# Altium footprint library PCB Library.PcbLib: 19 footprints (part 1 of 2)
Each footprint in its own frame and in the unit in brackets; x right, y up, seen from the top. Pads: shape width x height; smd on the part's side, far side on the other; paste and mask are expansions set on the pad; w line width, h text height; cw(c..) or ccw(c..) is an arc to the next point about the centre after c.
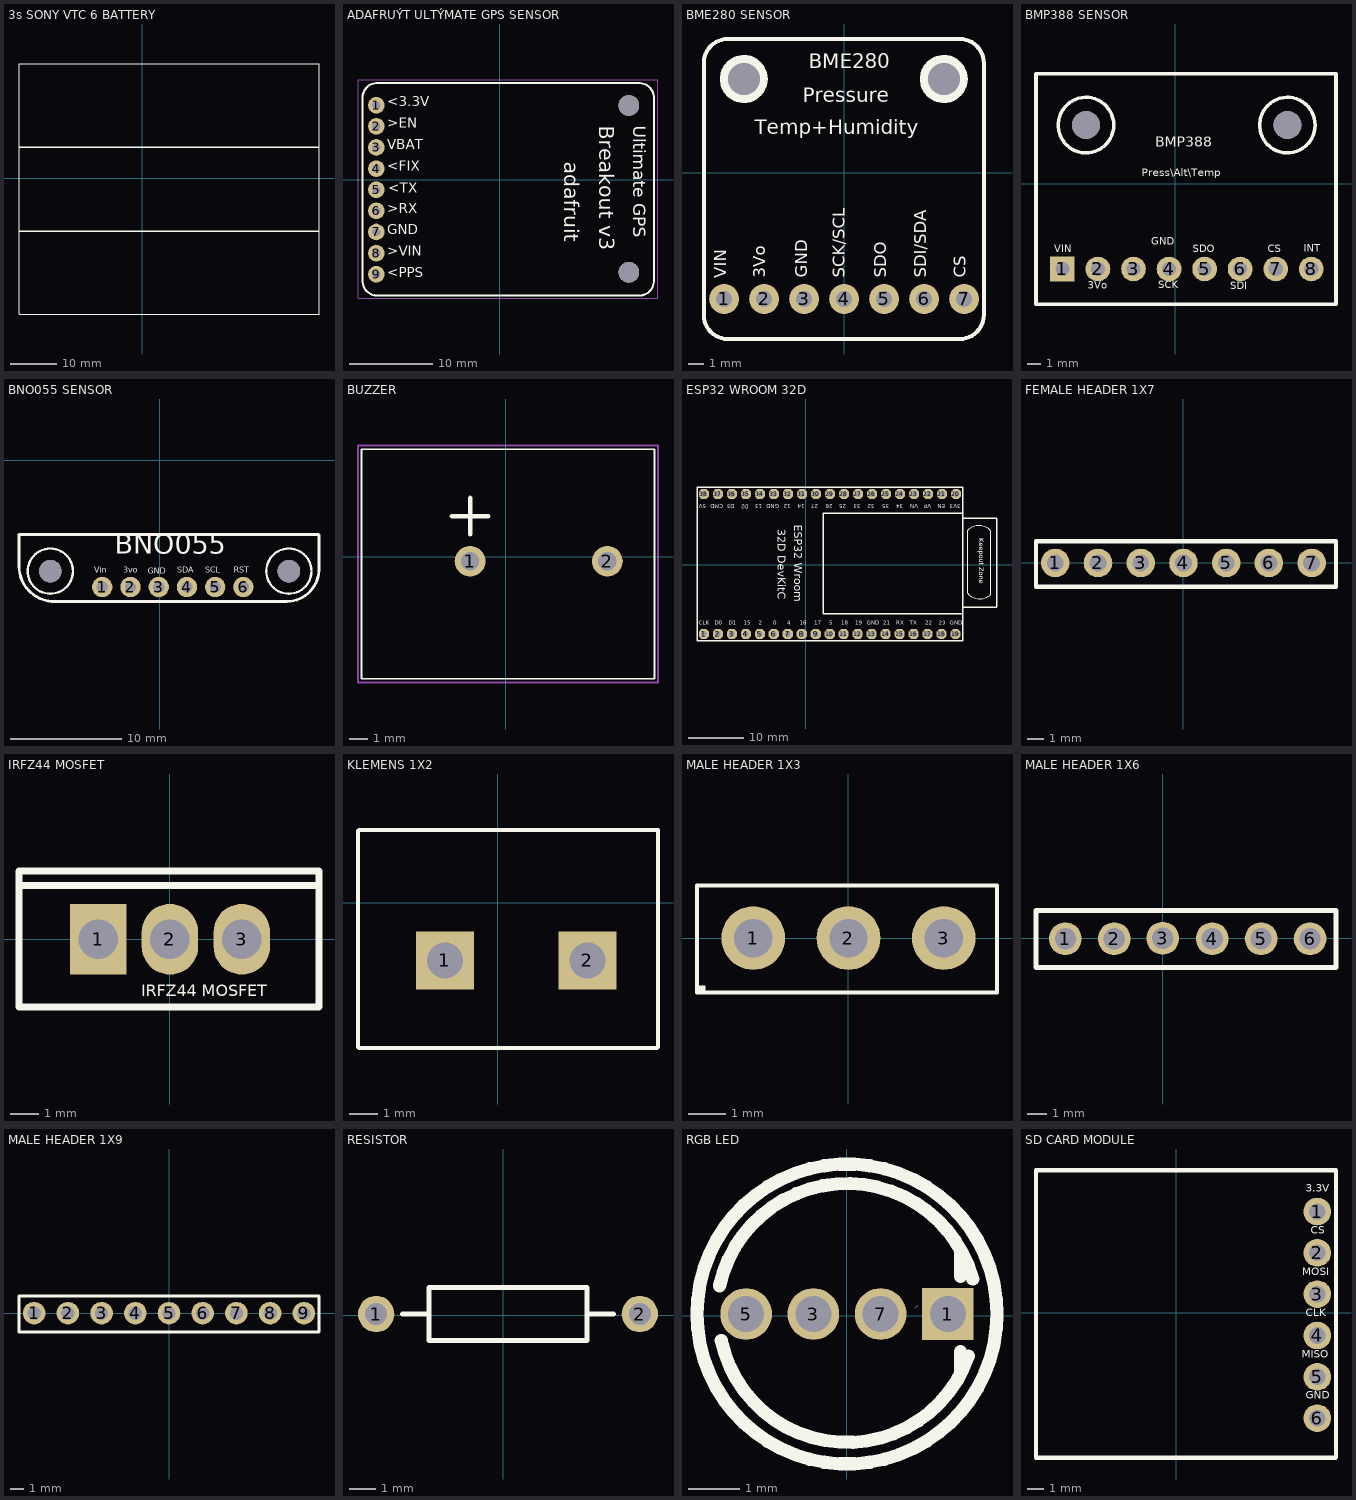
[diagram p0: the footprints below, top view; thin cyan lines are the x and y axes]

## 3s SONY VTC 6 BATTERY [mil]
Top Overlay:
  lines w3.94: -1050,-1159 1510,-1159 1510,-450 -1050,-450 -1050,-1159 ; -1050,-446 1510,-446 1510,263 -1050,263 -1050,-446 ; -1050,267 -1050,976 1510,976 1510,267 -1050,267
3D body "User Library-18650 Full.STEP": height 379.92, standoff -623.03, extent -1376.09,281.1 1681,1100
3D body "User Library-18650 Full.STEP": height 379.92, standoff -623.03, extent -1373,-445.45 1684.09,373.45
3D body "User Library-18650 Full.STEP": height 379.92, standoff -623.03, extent -1369,-1231 1688.09,-412.1
3D body "User Library-18650 battery with contacts (1).step": height 362.2, standoff -431.1, extent -1117.73,-459.2 1524,265.2
3D body "User Library-18650 battery with contacts (1).step": height 362.2, standoff -431.1, extent -1135.73,-1180.2 1506,-455.8
3D body "User Library-18650 battery with contacts (1).step": height 362.2, standoff -431.1, extent -1142.87,253.59 1498.87,978

## ADAFRUÝT ULTÝMATE GPS SENSOR [mil]
pads (11):
  round 78.74 hole 40: 1(-585,353) 2(-585,253) 3(-585,153) 4(-585,53) 5(-585,-47) 6(-585,-147) 7(-585,-247) 8(-585,-347) 9(-585,-447)
  round 98.43 hole 98.43: ""(610,-438) ""(610,352)
Top Overlay:
  lines w10: -650.43,384.43 cw(c-581.61,389.12) -578,458 660.83,458 ; -650.31,384.43 -650.31,-475.35 ccw(c-581.43,-478.96) -576.73,-547.78 656.1,-547.78 ccw(c659.71,-478.9) 728.53,-474.21 ; 654.77,457.85 cw(c659.06,388.63) 728.35,385.57 728.35,-474.21
  text "VBAT" at -533,128.06 h80
  text ">EN" at -533,229.05 h80
  text "<3.3V" at -533,331 h80
  text ">RX" at -533,-174.92 h80
  text "<TX" at -528,-78 h80
  text "<FIX" at -533,27.07 h80
  text ">VIN" at -533,-376.9 h80
  text "GND" at -533,-274.94 h80
  text "<PPS" at -533,-477 h80
  text "Ultimate GPS" at 609,256 h100
  text "adafruit" at 281,86 h120
  text "Breakout v3" at 445.12,256 h120
Mechanical 15:
  lines w3.94: -672,-560 748,-560 748,473 -597,473 -672,473 -672,-560
3D body "Adafruit Ultimate GPS Breakout.STEP": height 144.49, standoff 0, extent -668,-548 682,452
3D body "9x_Male_Pin_2.54_mm.STEP": height 108.02, standoff -328.98, extent -634.24,-497 -539.76,403

## BME280 SENSOR [mil]
pads (9):
  round 74.8 hole 40: 1(-300,-316) 2(-200,-316) 3(-100,-316) 4(0,-316) 5(100,-316) 6(200,-316) 7(300,-316)
  round 80 hole 80 unplated: ""(-251,234) ""(249,234)
Top Overlay:
  circle w30: c-251,234 r45
  circle w30: c249,234 r45
  lines w10: -351,-358 -351,274 cw(c-291,274) -291,334 ; -351,-356 ccw(c-291,-356) -291,-416 289,-416 ccw(c289,-356) 349,-356 349,274 ccw(c289,274) 289,334 -18,334 -292,334
  text "3Vo" at -187,-263 h51.18
  text "CS" at 314,-263 h51.18
  text "SDI/SDA" at 215,-263 h51.18
  text "SDO" at 115,-263 h51.18
  text "SCK/SCL" at 12,-263 h51.18
  text "GND" at -82,-263 h51.18
  text "VIN" at -285,-264 h51.18
  text "Temp+Humidity" at -224,84 h62.99
  text "Pressure" at -104,164 h62.99
  text "BME280" at -88.1,248.5 h62.99
3D body "7-Pin Header - Male - 2.54mm.step": height 98.35, standoff -371.65, extent -350,-366 350,-266
3D body "User Library-BME280-2.STEP": height 78.94, standoff -23.62, extent -351,-417 349,333

## BMP388 SENSOR [mil]
pads (10):
  rect 70x70 hole 40: 1(-320.45,-241)
  round 70 hole 40: 2(-219.66,-241) 3(-118.87,-241) 4(-18.09,-241) 5(82.7,-241) 6(183.49,-241) 7(284.28,-241) 8(385.06,-241)
  round 78.74 hole 78.74 unplated: ""(-253.52,166.87) ""(317.35,166.87)
Top Overlay:
  circle w10: c317.35,166.87 r78.74
  circle w10: c-253.52,166.87 r78.74
  lines w10: -395.25,-341 455.14,-341 455.14,312.54 -395.25,312.54 -395.25,-341
  text "Press\Alt\Temp" at -96.04,13.33 h37.99
  text "INT" at 364,-199 h35
  text "CS" at 262,-201 h35
  text "SDI" at 156,-305 h35
  text "SDO" at 49,-201 h35
  text "SCK" at -49,-303 h35
  text "GND" at -68,-179 h35
  text "3Vo" at -248,-304 h35
  text "VIN" at -344,-201 h35
  text "BMP388" at -56.67,96.01 h50
3D body "BMP388_breakout (1).STEP": height 79.69, standoff -374.64, extent -392.2,-340 458.2,313.54

## BNO055 SENSOR [mil]
pads (8):
  round 72 hole 40: 1(-204.2,-449.5) 2(-104.2,-449.5) 3(-4.2,-449.5) 4(95.8,-449.5) 5(195.8,-449.5) 6(295.8,-449.5)
  round 80 hole 80 unplated: ""(-388.15,-393.4) ""(456.83,-393.4)
Top Overlay:
  circle w8: c-388.15,-393.4 r80
  circle w8: c456.83,-393.4 r80
  lines w10: -498.99,-376.79 ccw(c-373.68,-375.55) -372.44,-500.86 ; -499,-375.55 -499,-264 562,-264 ; -373.68,-500.7 448.93,-500.7 ; 450.6,-500.69 ccw(c448.93,-386.06) 563.37,-379.24 563.37,-265.37
  text "RST" at 261,-406 h35
  text "SCL" at 161,-406 h35
  text "SDA" at 61,-406 h35
  text "GND" at -43.17,-409.15 h35
  text "3vo" at -129,-406 h35
  text "Vin" at -232.15,-405.6 h35
  text "BNO055" at -160,-355 h120
3D body "Adafruit_BNO055_AP214 (1).STEP": height 360.24, standoff 194.88, extent -499,-488 551,312

## BUZZER [mil]
pads (2):
  round 66.93 hole 40: 1(-78,-10) 2(221.21,-10)
Top Overlay:
  lines w3.94: -314.22,-265.91 323.57,-265.91 323.57,234.09 -314.22,234.09 -314.22,109.09 -314.22,-140.91 -314.22,-265.91
  lines w10: -117.37,88.43 -38.63,88.43 ; -78,49.06 -78,127.8
Mechanical 3:
  lines w3.94: -322.09,-273.78 -322.09,241.97 -314.22,241.97 331.45,241.97 331.45,-273.78 -322.09,-273.78
3D body "User Library-WST-1203UX.step": height 379.92, standoff -177.17, extent -300.6,-246.22 307.83,226.22

## ESP32 WROOM 32D [mil]
pads (38):
  oct 72.01x72.01 hole 40.39: 1(-729,-493.58) 2(-629.16,-493.58) 3(-529.32,-493.58) 4(-429.47,-493.58) 5(-329.63,-493.58) 6(-229.79,-493.58) 7(-129.94,-493.58) 8(-30.1,-493.58) 9(69.74,-493.58) 10(169.58,-493.58) 11(269.43,-493.58) 12(369.27,-493.58) 13(469.11,-493.58) 14(568.95,-493.58) 15(668.8,-493.58) 16(768.64,-493.58) 17(868.48,-493.58) 18(968.32,-493.58) 19(1068.17,-493.58) 20(1071,506) 21(971,506) 22(871,506) 23(771,506) 24(671,506) 25(571,506) 26(471,506) 27(371,506) 28(271,506) 29(171,506) 30(71,506) 31(-29,506) 32(-129,506) 33(-229,506) 34(-329,506) 35(-429,506) 36(-529,506) 37(-629,506) 38(-729,506)
Top Overlay:
  lines w5: 1155,-204 ccw(c1241.42,-126.37) 1321,-211 ; 1155,-204 1155,249 ; 1155,-204 1155,249 ; 1155,249 cw(c1234.5,162.5) 1321,242 ; 1321,-211 1321,242 ; 1321,-211 1321,242
  lines w10: 1118,-348 125,-348 125,368 1120,368 ; 1119,-301 1363.09,-301 ; 1119,556 -778,556 -778,-543 1120,-543 ; 1119.64,-542.43 1119.64,556 ; 1120,333 1364.09,333 1364.09,-300
  text "Keepout Zone" at 1222,191 h60
  text "CLK" at -764,-437 h47.24
  text "D0" at -650,-437 h47.24
  text "D1" at -551,-438 h47.24
  text "15" at -443,-437 h47.24
  text "2" at -336,-438 h47.24
  text "0" at -234,-439 h47.24
  text "4" at -132,-437 h47.24
  text "16" at -43,-437 h47.24
  text "17" at 59,-437 h47.24
  text "5" at 166,-437 h47.24
  text "18" at 253,-437 h47.24
  text "19" at 352,-437 h47.24
  text "GND" at 434,-437 h47.24
  text "21" at 553,-438 h47.24
  text "RX" at 645,-437 h47.24
  text "TX" at 742,-439 h47.24
  text "22" at 850,-438 h47.24
  text "23" at 947,-439 h47.24
  text "GND" at 1026,-438 h47.24
  text "CMD" at -592,445 h47.24
  text "D3" at -507,444 h47.24
  text "D2" at -409,442 h47.24
  text "13" at -311,444 h47.24
  text "GND" at -192,444 h47.24
  text "27" at 87,445 h47.24
  text "26" at 191,445 h47.24
  text "25" at 289,445 h47.24
  text "33" at 390,445 h47.24
  text "32" at 491,445 h47.24
  text "35" at 593,445 h47.24
  text "34" at 693,443 h47.24
  text "VN" at 801,445 h47.24
  text "VP" at 894,445 h47.24
  text "EN" at 995,445 h47.24
  text "3V3" at 1107,445 h47.24
  text "ESP32 Wroom" at -106,285 h98.43
  text "5V" at -711,445 h47.24
  text "32D DevKitC" at -223,254 h98.43
  text "Keepout Zone" at 1222,191 h60
  text "12" at -110,444 h47.24
  text "14" at -7,444 h47.24
3D body "PCB_ESP32-38Pines.step": height 181.89, standoff -216.54, extent -945.15,-530 1239.15,572.36

## FEMALE HEADER 1X7 [mm]
pads (7):
  round 1.7 hole 1: 1(-7.62,0) 2(-5.08,0) 3(-2.54,0) 4(0,0) 5(2.54,0) 6(5.08,0) 7(7.62,0)
Top Overlay:
  lines w0.254: -8.763,-1.422 -8.763,1.295 9.068,1.295 9.068,-1.422 -8.763,-1.422
3D body "zl262-7s_p2-54_l18-3_w2-54_h8-5.stp": height 8.5, standoff -3, extent -9.216,-1.27 9.064,1.27

## IRFZ44 MOSFET [mm]
pads (3):
  rect 2x2.5 hole 1.4: 1(-2.54,0)
  oval 2x2.5 hole 1.4: 2(0,0) 3(2.54,0)
Top Overlay:
  lines w0.254: -5.334,1.905 5.266,1.905 ; -5.334,-2.388 -5.334,2.41 5.268,2.41 5.268,-2.388 -5.334,-2.388
  text "IRFZ44 MOSFET" at -1.016,-2.159 h0.7
3D body "79963.stp": height 22.26, standoff -8.73, extent -5.385,-2.491 5.285,2.339

## KLEMENS 1X2 [mil]
pads (2):
  rect 80x80 hole 50: 1(-72.72,-79.65) 2(124.13,-79.65)
Top Overlay:
  lines w5: -192.8,99.49 -192.8,-199.72 -191.82,-200.71 220.58,-200.71 221.57,-199.72 221.57,99.49 221.57,100.47 -191.82,100.47
Mechanical 1:
  lines w5: -192.8,-199.72 -192.8,99.49
3D body "terminal block 2pin.STEP": height 393.7, standoff -153.47, extent -193.79,-199.72 223.53,99.49

## MALE HEADER 1X3 [mm]
pads (3):
  round 1.7 hole 1.026: 1(-2.54,0) 2(0,0) 3(2.54,0)
Top Overlay:
  rectangle: -4.013,-1.448 -3.81,-1.27
  lines w0.1: -4.04,-1.448 3.96,-1.448 3.96,1.4 -4.04,1.4 -4.04,-1.448
3D body "User Library-1x3 TH Pitch 2_54mm.STEP": height 3.5, standoff -9.2, extent -3.81,-1.219 3.81,1.321

## MALE HEADER 1X6 [mm]
pads (7):
  round 1.7 hole 1.1: 1(-5.055,-0.025) 2(-2.515,-0.025) 3(0,0) 4(2.565,-0.025) 5(5.105,-0.025) 5(5.105,-0.025) 6(7.645,-0.025)
Top Overlay:
  lines w0.254: -6.579,-1.524 8.992,-1.524 8.992,1.448 -6.579,1.448 -6.579,-1.524
3D body "User Library-1x6 TH Pitch 2_54mm.STEP": height 3.5, standoff -9.2, extent -6.299,-1.346 8.941,1.194

## MALE HEADER 1X9 [mm]
pads (9):
  round 1.7 hole 1: 1(-10.16,0) 2(-7.62,0) 3(-5.08,0) 4(-2.54,0) 5(0,0) 6(2.54,0) 7(5.08,0) 8(7.62,0) 9(10.16,0)
Top Overlay:
  lines w0.254: -11.303,-1.422 -11.303,1.295 11.303,1.295 11.303,-1.422 -11.303,-1.422
3D body "9-Pin Header - Male - 2.54mm.step": height 3.05, standoff -8.89, extent -11.354,-1.219 11.506,1.321

## RESISTOR [mm]
pads (2):
  round 1.4 hole 0.85: 1(-4.902,0.051) 2(5.258,0.051)
Top Overlay:
  lines w0.2: -3.886,0.051 -2.87,0.051 ; 3.226,0.051 4.242,0.051 ; -2.87,-0.965 -2.87,1.067 3.226,1.067 3.226,-0.965 -2.87,-0.965
3D body "User Library-AXIAL_RESISTOR(0_25W).step": height 2.6, standoff -1.5, extent -5.222,-1.206 5.578,1.194

## RGB LED [mm]
pads (4):
  rect 1x1 hole 0.7: 1(1.954,0.03)
  round 1 hole 0.7: 3(-0.646,0.03) 5(-1.946,0.03) 7(0.654,0.03)
Top Overlay:
  circle w0.254: c0.004,0.03 r2.9
  lines w0.254: -2.46,0.573 cw(c0.004,0.03) 2.434,0.71 ; -2.426,-0.48 ccw(c0.004,0.03) 2.351,-0.782 ; 2.202,-1.122 2.202,-0.701 ; 2.202,0.761 2.202,1.27
Mechanical 5:
  circle w0.25: c1.954,0.03 r0.125
  circle w0.25: c0.654,0.03 r0.125
  circle w0.25: c-0.646,0.03 r0.125
  circle w0.25: c-1.946,0.03 r0.125
Mechanical 15:
  lines w0.003: 1.327,0.146 1.378,0.197
3D body "User Library-LED_5MM_RGB v4.step": height 7.99, standoff -6.7, extent -2.616,-3 2.984,3

## SD CARD MODULE [mil]
pads (6):
  round 66.93 hole 40: 1(341,245) 2(341,145) 3(341,45) 4(341,-55) 5(341,-155) 6(341,-255)
Top Overlay:
  lines w10: -339.65,343.88 -339.65,-351 385,-351 386.35,-349.65 386.35,345 -339.65,345
  text "3.3V" at 313,287 h31.5
  text "CS" at 325,185 h31.5
  text "MOSI" at 305,85 h31.5
  text "CLK" at 313,-15 h31.5
  text "MISO" at 304,-115 h31.5
  text "GND" at 313,-214 h31.5
3D body "6x_Male_Pin_2.54_mm.STEP": height 108.02, standoff -328.98, extent 294.51,-310 389,290
3D body "MicroSD Card Module - 1.stp": height 132.93, standoff -1, extent -420,-365.5 392,347.5